# Altium schematic symbol library FPGA_Xilinx_Virtex6.SchLib: 28 symbols (part 1 of 21) (continued)
## XC6VHX250T-FF1154 (continued)
part N pins: AA1 GND (power), AA2 GND (power), AA5 GND (power), AA6 GND (power), AA9 GND (power), AA11 GND (power), AA13 GND (power), AA15 GND (power), AA17 GND (power), AA19 GND (power), AA21 GND (power), AA23 GND (power), AA26 GND (power), AA29 GND (power), AA30 GND (power), AA33 GND (power), AA34 GND (power), AB3 GND (power), AB4 GND (power), AB7 GND (power), AB9 GND (power), AB12 GND (power), AB14 GND (power), AB16 GND (power), AB18 GND (power), AB20 GND (power), AB22 GND (power), AB24 GND (power), AB26 GND (power), AB28 GND (power), AB31 GND (power), AB32 GND (power), AC1 GND (power), AC5 GND (power), AC6 GND (power), AC9 GND (power), AC15 GND (power), AC25 GND (power), AC26 GND (power), AC29 GND (power), AC30 GND (power), AC34 GND (power), AD4 GND (power), AD7 GND (power), AD9 GND (power), AD12 GND (power), AD22 GND (power), AD26 GND (power), AD28 GND (power), AD31 GND (power), AE1 GND (power), AE2 GND (power), AE5 GND (power), AE6 GND (power), AE9 GND (power), AE19 GND (power), AE26 GND (power), AE29 GND (power), AE30 GND (power), AE33 GND (power), AE34 GND (power), AF3 GND (power), AF4 GND (power), AF7 GND (power), AF9 GND (power), AF16 GND (power), AF26 GND (power), AF28 GND (power), AF31 GND (power), AF32 GND (power), AG1 GND (power), AG5 GND (power), AG6 GND (power), AG9 GND (power), AG13 GND (power), AG23 GND (power), AG26 GND (power), AG29 GND (power), AG30 GND (power), AG34 GND (power), AH4 GND (power), AH7 GND (power), AH9 GND (power), AH10 GND (power), AH20 GND (power), AH26 GND (power), AH28 GND (power), AH31 GND (power), AJ1 GND (power), AJ2 GND (power), AJ5 GND (power), AJ6 GND (power), AJ9 GND (power), AJ17 GND (power), AJ26 GND (power), AJ29 GND (power), AJ30 GND (power), AJ33 GND (power), AJ34 GND (power), AK3 GND (power), AK4 GND (power), AK7 GND (power), AK9 GND (power), AK14 GND (power), AK24 GND (power), AK26 GND (power), AK28 GND (power), AK31 GND (power), AK32 GND (power), AL1 GND (power), AL5 GND (power), AL6 GND (power), AL8 GND (power), AL9 GND (power), AL11 GND (power), AL21 GND (power), AL26 GND (power), AL27 GND (power), AL29 GND (power), AL30 GND (power), AL34 GND (power), AM4 GND (power), AM6 GND (power), AM7 GND (power), AM8 GND (power), AM18 GND (power), AM27 GND (power), AM28 GND (power), AM29 GND (power), AM31 GND (power), AN1 GND (power), AN2 GND (power), AN5 GND (power), AN6 GND (power), AN15 GND (power), AN25 GND (power), AN29 GND (power), AN30 GND (power), AN33 GND (power), AN34 GND (power), AP3 GND (power), AP4 GND (power), AP6 GND (power), AP12 GND (power), AP22 GND (power), AP29 GND (power), AP31 GND (power), AP32 GND (power), K28 GND (power), K31 GND (power), K32 GND (power), L1 GND (power), L5 GND (power), L6 GND (power), L9 GND (power), L11 GND (power), L21 GND (power), L26 GND (power), L29 GND (power), L30 GND (power), L34 GND (power), M4 GND (power), M7 GND (power), M9 GND (power), M18 GND (power), M26 GND (power), M28 GND (power), M31 GND (power), N1 GND (power), N2 GND (power), N5 GND (power), N6 GND (power), N9 GND (power), N11 GND (power), N13 GND (power), N15 GND (power), N17 GND (power), N19 GND (power), N21 GND (power), N23 GND (power), N25 GND (power), N26 GND (power), N29 GND (power), N30 GND (power), N33 GND (power), N34 GND (power), P3 GND (power), P4 GND (power), P7 GND (power), P9 GND (power), P12 GND (power), P14 GND (power), P16 GND (power), P18 GND (power), P20 GND (power), P22 GND (power), P24 GND (power), P26 GND (power), P28 GND (power), P31 GND (power), P32 GND (power), R1 GND (power), R5 GND (power), R6 GND (power), R9 GND (power), R11 GND (power), R13 GND (power), R15 GND (power), R17 GND (power), R19 GND (power), R21 GND (power), R23 GND (power), R25 GND (power), R26 GND (power), R29 GND (power), R30 GND (power), R34 GND (power), T4 GND (power), T7 GND (power), T9 GND (power), T10 GND (power), T12 GND (power), T14 GND (power), T16 GND (power), T20 GND (power), T22 GND (power), T24 GND (power), T25 GND (power), T26 GND (power), T28 GND (power), T31 GND (power), U1 GND (power), U2 GND (power), U5 GND (power), U6 GND (power), U9 GND (power), U10 GND (power), U11 GND (power), U13 GND (power), U15 GND (power), U19 GND (power), U21 GND (power), U23 GND (power), U25 GND (power), U26 GND (power), U29 GND (power), U30 GND (power), U33 GND (power), U34 GND (power), V3 GND (power), V4 GND (power), V7 GND (power), V9 GND (power), V10 GND (power), V12 GND (power), V14 GND (power), V16 GND (power), V20 GND (power), V22 GND (power), V24 GND (power), V25 GND (power), V26 GND (power), V28 GND (power), V31 GND (power), V32 GND (power), W1 GND (power), W5 GND (power), W6 GND (power), W9 GND (power), W10 GND (power), W11 GND (power), W13 GND (power), W15 GND (power), W19 GND (power), W21 GND (power), W23 GND (power), W25 GND (power), W26 GND (power), W29 GND (power), W30 GND (power), W34 GND (power), Y4 GND (power), Y7 GND (power), Y9 GND (power), Y10 GND (power), Y12 GND (power), Y14 GND (power), Y16 GND (power), Y18 GND (power), Y20 GND (power), Y22 GND (power), Y24 GND (power), Y25 GND (power), Y26 GND (power), Y28 GND (power), Y31 GND (power)

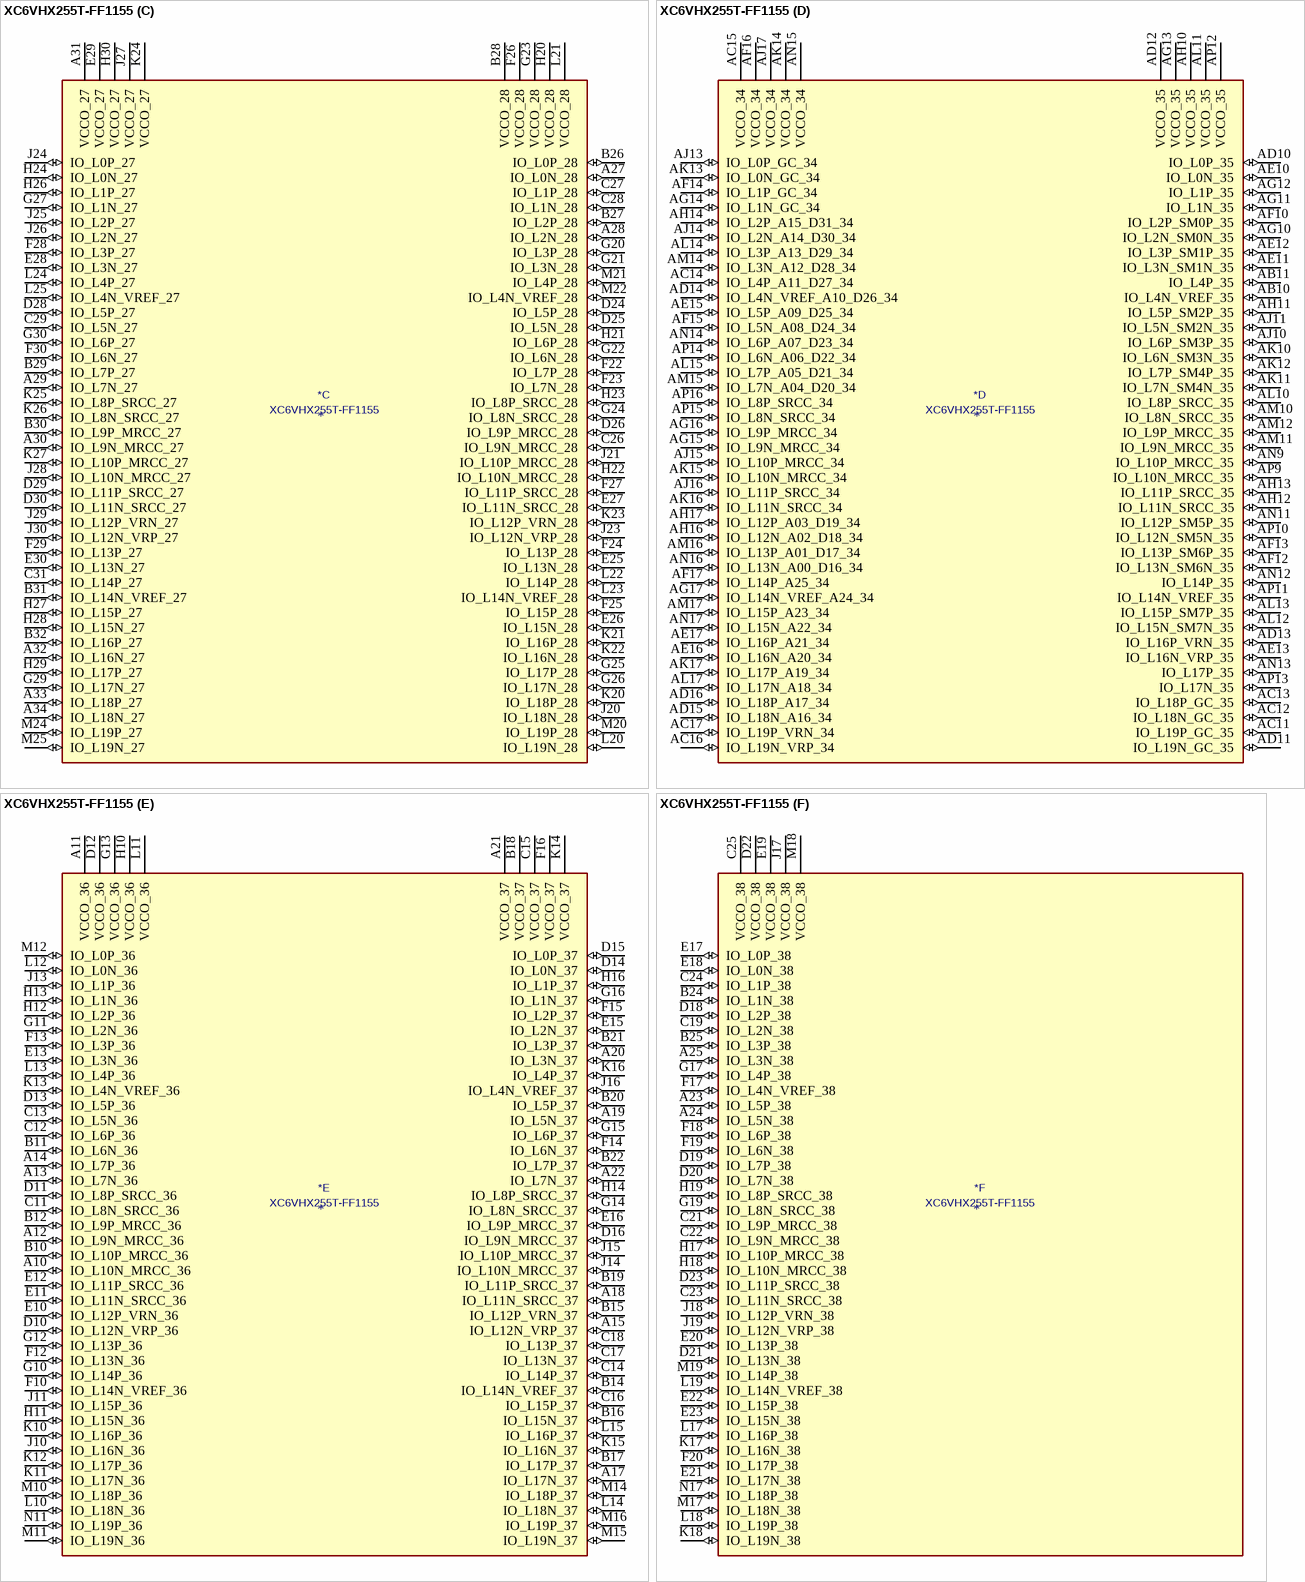
[diagram p3: symbol XC6VHX255T-FF1155]

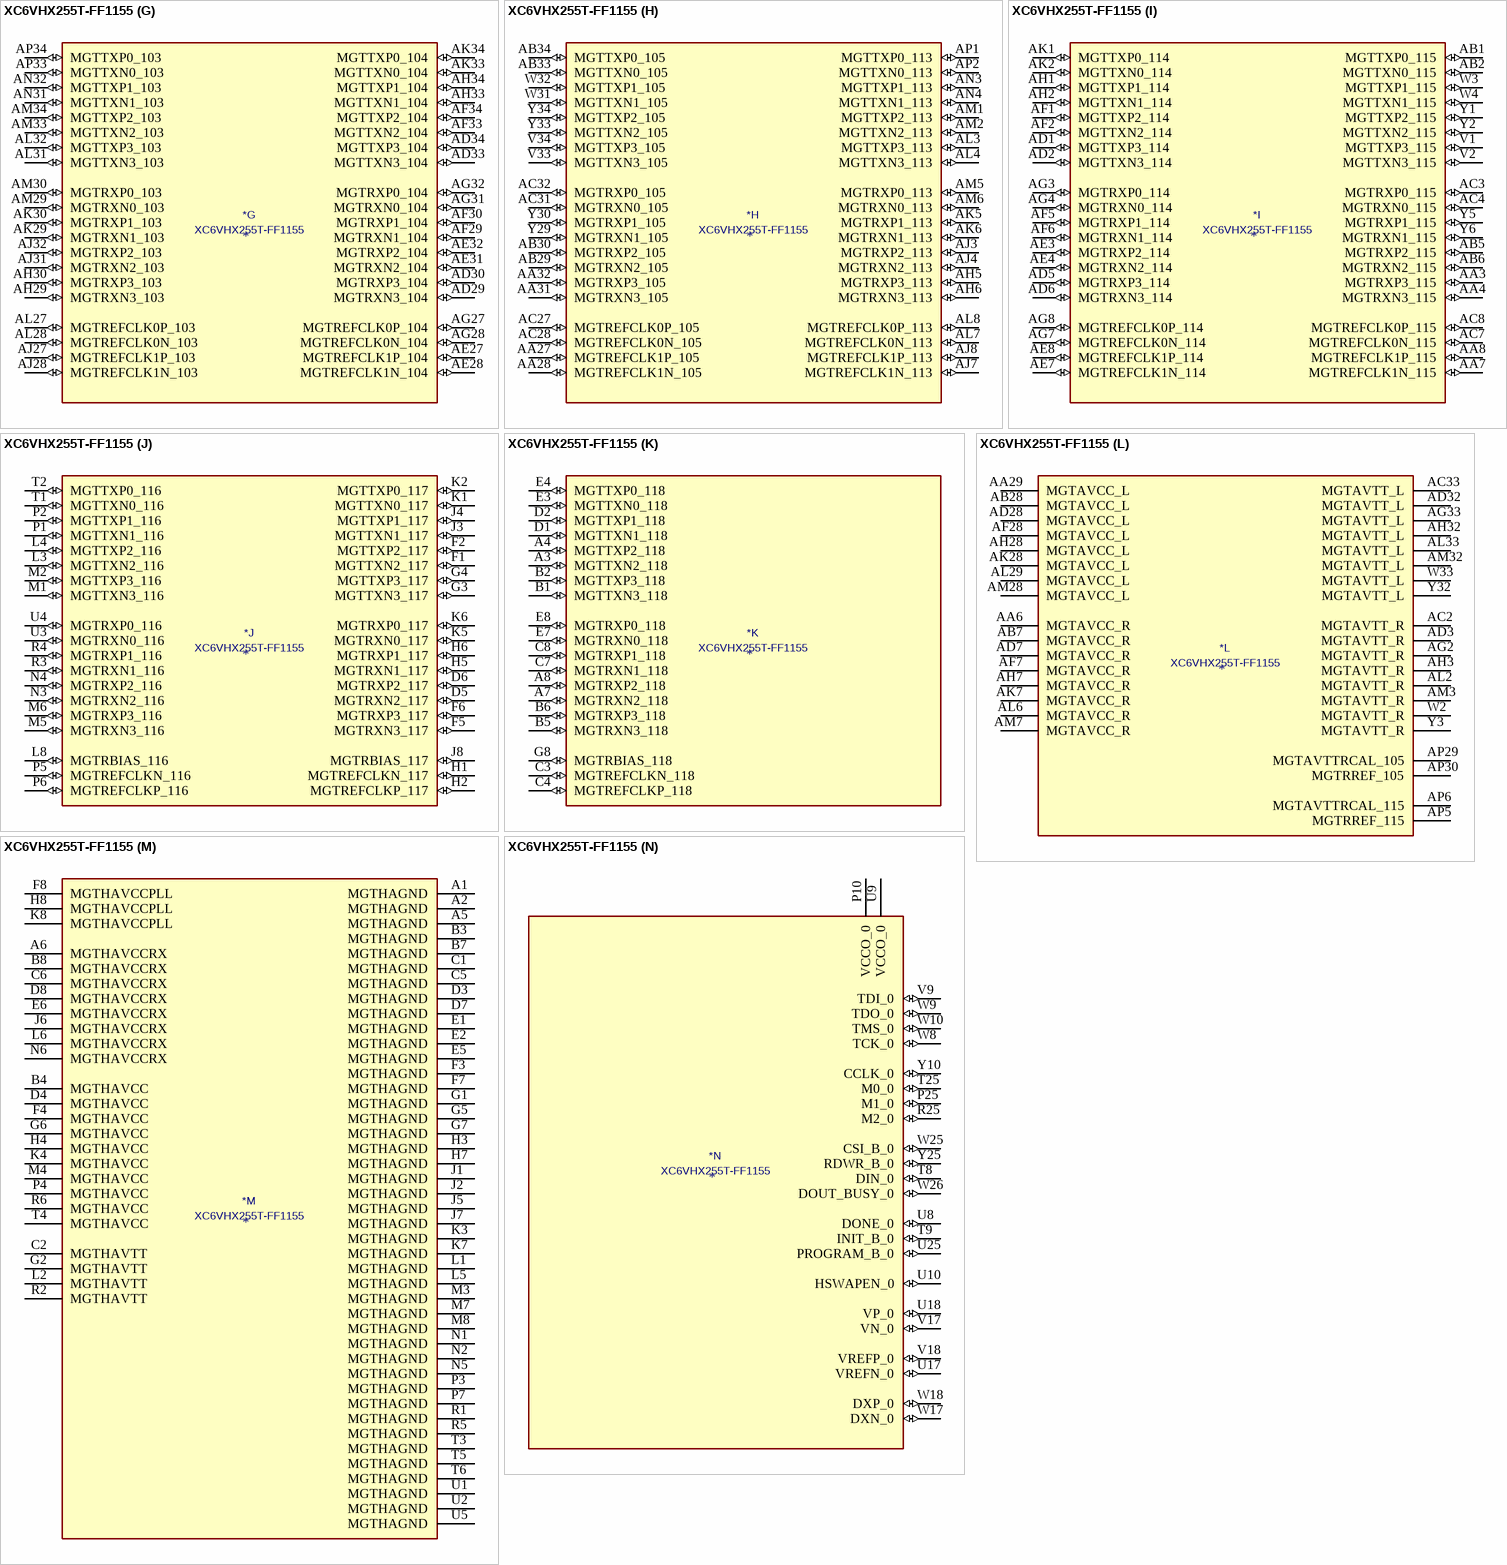
[diagram p4: symbol XC6VHX255T-FF1155]

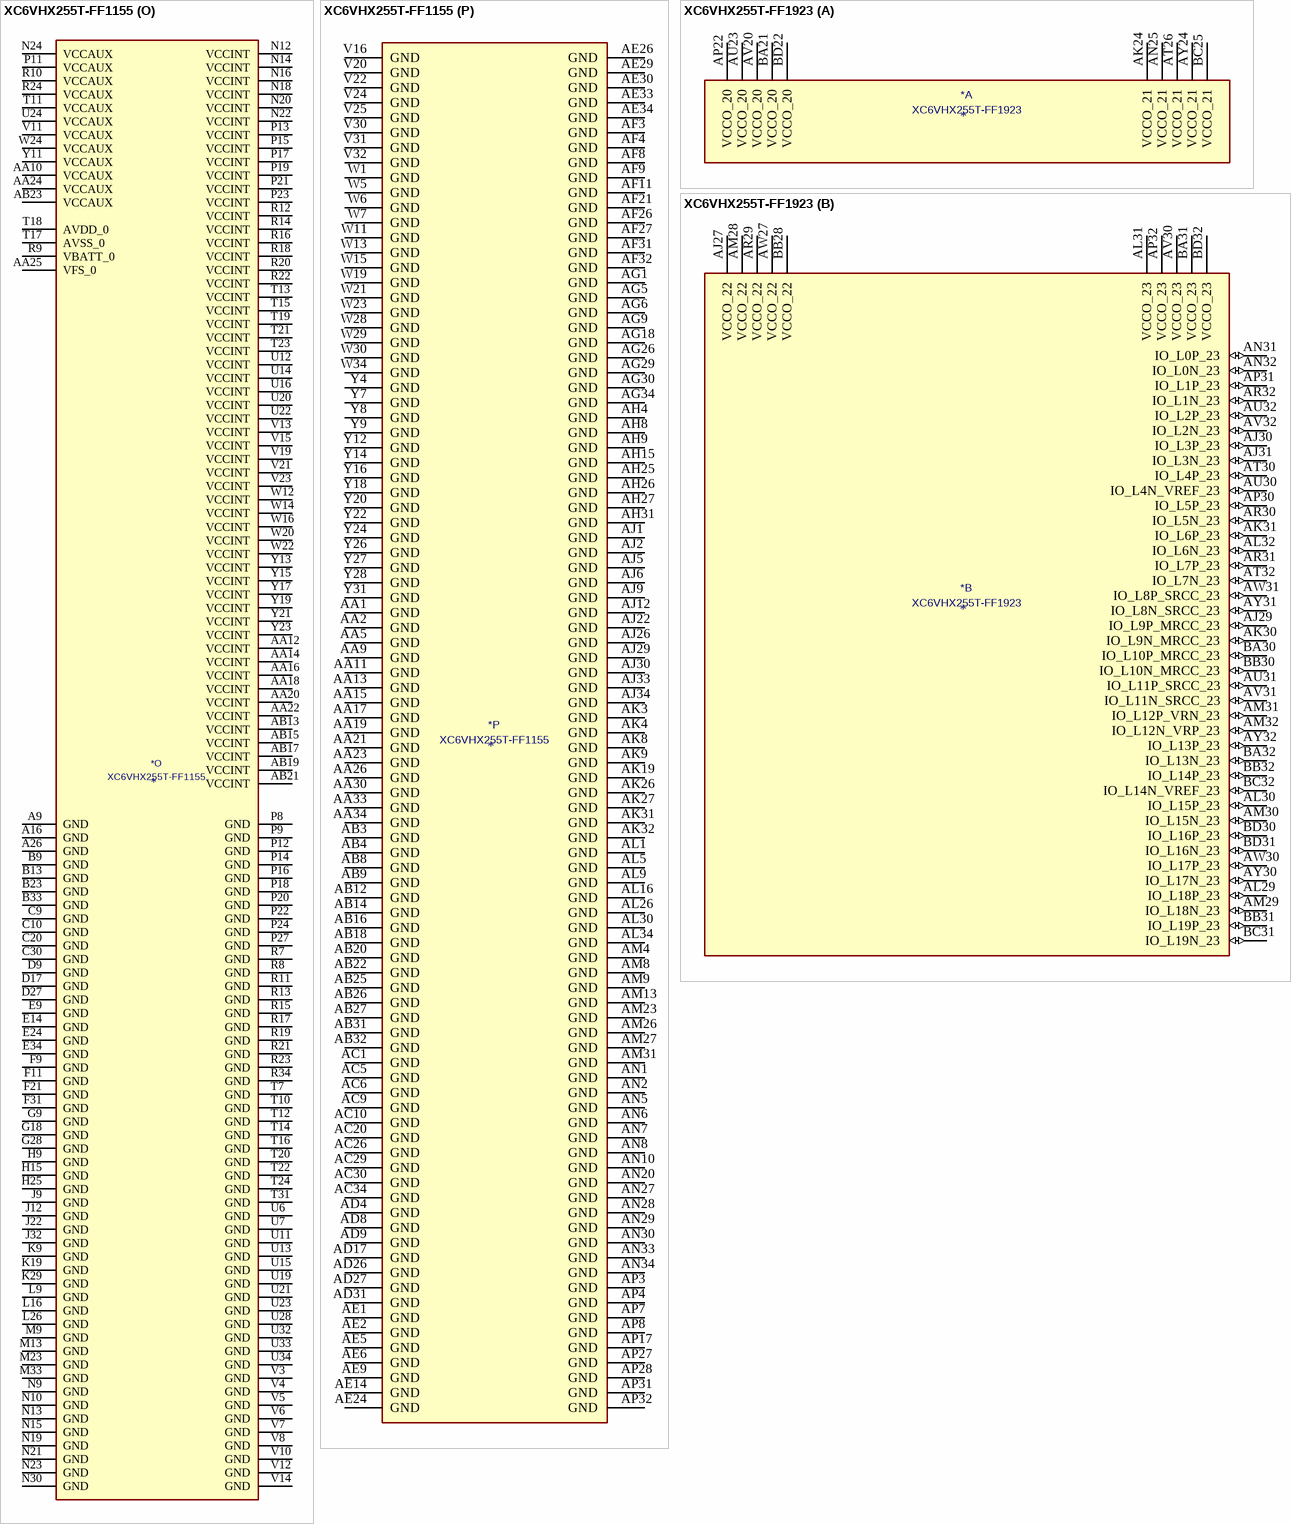
[diagram p5: symbols XC6VHX255T-FF1155 to XC6VHX255T-FF1923]

## XC6VHX255T-FF1155
designator *  value XC6VHX255T-FF1155
ki_keywords: FPGA; ki_description: Virtex 6 HXT 255 XC6VHX255T-FF1155
part A pins: AB24 IO_L4P_D11_24 (io), AC18 IO_L19P_23 (io), AC19 IO_L19N_23 (io), AC21 IO_L4P_23 (io), AC22 IO_L7P_D5_24 (io), AC23 IO_L7N_D4_24 (io), AC24 IO_L4N_VREF_D10_24 (io), AC25 VCCO_24 (power), AD18 IO_L17P_23 (io), AD19 IO_L12P_VRN_23 (io), AD20 IO_L12N_VRP_23 (io), AD21 IO_L4N_VREF_23 (io), AD22 VCCO_24 (power), AD23 IO_L5P_D9_24 (io), AD24 IO_L19P_24 (io), AD25 IO_L19N_24 (io), AE18 IO_L17N_23 (io), AE19 VCCO_23 (power), AE20 IO_L5P_23 (io), AE21 IO_L5N_23 (io), AE22 IO_L9P_MRCC_24 (io), AE23 IO_L5N_D8_24 (io), AE25 IO_L0P_GC_24 (io), AF18 IO_L13P_23 (io), AF19 IO_L13N_23 (io), AF20 IO_L10P_MRCC_23 (io), AF22 IO_L17P_VRN_24 (io), AF23 IO_L9N_MRCC_24 (io), AF24 IO_L2P_D15_24 (io), AF25 IO_L0N_GC_24 (io), AG19 IO_L9P_MRCC_23 (io), AG20 IO_L10N_MRCC_23 (io), AG21 IO_L1P_23 (io), AG22 IO_L17N_VRP_24 (io), AG23 VCCO_24 (power), AG24 IO_L12P_D3_24 (io), AG25 IO_L2N_D14_24 (io), AH18 IO_L15P_23 (io), AH19 IO_L9N_MRCC_23 (io), AH20 VCCO_23 (power), AH21 IO_L1N_23 (io), AH22 IO_L11P_SRCC_24 (io), AH23 IO_L11N_SRCC_24 (io), AH24 IO_L12N_D2_FS2_24 (io), AJ18 IO_L15N_23 (io), AJ19 IO_L14P_23 (io), AJ20 IO_L14N_VREF_23 (io), AJ21 IO_L0P_23 (io), AJ23 IO_L14P_FCS_B_24 (io), AJ24 IO_L14N_VREF_FOE_B_MOSI_24 (io), AJ25 IO_L6P_D7_24 (io), AK18 IO_L11P_SRCC_23 (io), AK20 IO_L8P_SRCC_23 (io), AK21 IO_L0N_23 (io), AK22 IO_L13P_D1_FS1_24 (io), AK23 IO_L13N_D0_FS0_24 (io), AK24 VCCO_24 (power), AK25 IO_L6N_D6_24 (io), AL18 IO_L11N_SRCC_23 (io), AL19 IO_L7P_23 (io), AL20 IO_L8N_SRCC_23 (io), AL21 VCCO_23 (power), AL22 IO_L15P_FWE_B_24 (io), AL23 IO_L3P_D13_24 (io), AL24 IO_L3N_D12_24 (io), AL25 IO_L1P_GC_24 (io), AM18 VCCO_23 (power), AM19 IO_L7N_23 (io), AM20 IO_L6P_23 (io), AM21 IO_L2P_23 (io), AM22 IO_L15N_RS1_24 (io), AM24 IO_L16P_RS0_24 (io), AM25 IO_L1N_GC_24 (io), AN18 IO_L18P_23 (io), AN19 IO_L3P_23 (io), AN21 IO_L6N_23 (io), AN22 IO_L2N_23 (io), AN23 IO_L18P_24 (io), AN24 IO_L16N_CSO_B_24 (io), AN25 VCCO_24 (power), AN26 IO_L8P_SRCC_24 (io), AP18 IO_L18N_23 (io), AP19 IO_L3N_23 (io), AP20 IO_L16P_23 (io), AP21 IO_L16N_23 (io), AP22 VCCO_23 (power), AP23 IO_L18N_24 (io), AP24 IO_L10P_MRCC_24 (io), AP25 IO_L10N_MRCC_24 (io), AP26 IO_L8N_SRCC_24 (io)
part B pins: B34 IO_L9N_MRCC_26 (io), C32 IO_L1N_26 (io), C33 IO_L9P_MRCC_26 (io), C34 IO_L0N_26 (io), D31 IO_L1P_26 (io), D32 VCCO_26 (power), D33 IO_L0P_26 (io), D34 IO_L8N_SRCC_26 (io), E31 IO_L3P_26 (io), E32 IO_L3N_26 (io), E33 IO_L8P_SRCC_26 (io), F32 IO_L5N_26 (io), F33 IO_L7N_26 (io), F34 IO_L10N_MRCC_26 (io), G31 IO_L5P_26 (io), G32 IO_L7P_26 (io), G33 VCCO_26 (power), G34 IO_L10P_MRCC_26 (io), H31 IO_L11N_SRCC_26 (io), H32 IO_L2P_26 (io), H33 IO_L2N_26 (io), H34 IO_L12N_VRP_26 (io), J31 IO_L11P_SRCC_26 (io), J33 IO_L6N_26 (io), J34 IO_L12P_VRN_26 (io), K28 IO_L4N_VREF_26 (io), K30 IO_L17N_26 (io), K31 IO_L13P_26 (io), K32 IO_L13N_26 (io), K33 IO_L6P_26 (io), K34 VCCO_26 (power), L27 IO_L4P_26 (io), L28 IO_L15P_26 (io), L29 IO_L15N_26 (io), L30 IO_L17P_26 (io), L31 VCCO_26 (power), L32 IO_L16N_26 (io), L33 IO_L14P_26 (io), L34 IO_L14N_VREF_26 (io), M26 IO_L19P_26 (io), M27 IO_L19N_26 (io), M28 VCCO_26 (power), M29 IO_L18P_26 (io), M30 IO_L18N_26 (io), M31 IO_L16P_26 (io), M32 IO_L0N_25 (io), M34 IO_L5N_SM10N_25 (io), N25 VCCO_25 (power), N26 IO_L17N_25 (io), N27 IO_L4P_25 (io), N28 IO_L4N_VREF_25 (io), N29 IO_L8N_SRCC_25 (io), N31 IO_L12N_SM13N_25 (io), N32 IO_L0P_25 (io), N33 IO_L1N_25 (io), N34 IO_L5P_SM10P_25 (io), P26 IO_L17P_25 (io), P28 IO_L2N_SM8N_25 (io), P29 IO_L8P_SRCC_25 (io), P30 IO_L3N_SM9N_25 (io), P31 IO_L12P_SM13P_25 (io), P32 VCCO_25 (power), P33 IO_L1P_25 (io), P34 IO_L9N_MRCC_25 (io), R26 IO_L6P_SM11P_25 (io), R27 IO_L6N_SM11N_25 (io), R28 IO_L2P_SM8P_25 (io), R29 VCCO_25 (power), R30 IO_L3P_SM9P_25 (io), R31 IO_L16P_VRN_25 (io), R32 IO_L16N_VRP_25 (io), R33 IO_L9P_MRCC_25 (io), T26 VCCO_25 (power), T27 IO_L11P_SRCC_25 (io), T28 IO_L11N_SRCC_25 (io), T29 IO_L7P_SM12P_25 (io), T30 IO_L7N_SM12N_25 (io), T32 IO_L10N_MRCC_25 (io), T33 IO_L13P_SM14P_25 (io), T34 IO_L13N_SM14N_25 (io), U26 IO_L14P_25 (io), U27 IO_L14N_VREF_25 (io), U29 IO_L15P_SM15P_25 (io), U30 IO_L15N_SM15N_25 (io), U31 IO_L10P_MRCC_25 (io), V26 IO_L18P_GC_25 (io), V27 IO_L18N_GC_25 (io), V28 IO_L19P_GC_25 (io), V29 IO_L19N_GC_25 (io), W27 VCCO_25 (power)
part C pins: A27 IO_L0N_28 (io), A28 IO_L2N_28 (io), A29 IO_L7N_27 (io), A30 IO_L9N_MRCC_27 (io), A31 VCCO_27 (power), A32 IO_L16N_27 (io), A33 IO_L18P_27 (io), A34 IO_L18N_27 (io), B26 IO_L0P_28 (io), B27 IO_L2P_28 (io), B28 VCCO_28 (power), B29 IO_L7P_27 (io), B30 IO_L9P_MRCC_27 (io), B31 IO_L14N_VREF_27 (io), B32 IO_L16P_27 (io), C26 IO_L9N_MRCC_28 (io), C27 IO_L1P_28 (io), C28 IO_L1N_28 (io), C29 IO_L5N_27 (io), C31 IO_L14P_27 (io), D24 IO_L5P_28 (io), D25 IO_L5N_28 (io), D26 IO_L9P_MRCC_28 (io), D28 IO_L5P_27 (io), D29 IO_L11P_SRCC_27 (io), D30 IO_L11N_SRCC_27 (io), E25 IO_L13N_28 (io), E26 IO_L15N_28 (io), E27 IO_L11N_SRCC_28 (io), E28 IO_L3N_27 (io), E29 VCCO_27 (power), E30 IO_L13N_27 (io), F22 IO_L7P_28 (io), F23 IO_L7N_28 (io), F24 IO_L13P_28 (io), F25 IO_L15P_28 (io), F26 VCCO_28 (power), F27 IO_L11P_SRCC_28 (io), F28 IO_L3P_27 (io), F29 IO_L13P_27 (io), F30 IO_L6N_27 (io), G20 IO_L3P_28 (io), G21 IO_L3N_28 (io), G22 IO_L6N_28 (io), G23 VCCO_28 (power), G24 IO_L8N_SRCC_28 (io), G25 IO_L17P_28 (io), G26 IO_L17N_28 (io), G27 IO_L1N_27 (io), G29 IO_L17N_27 (io), G30 IO_L6P_27 (io), H20 VCCO_28 (power), H21 IO_L6P_28 (io), H22 IO_L10N_MRCC_28 (io), H23 IO_L8P_SRCC_28 (io), H24 IO_L0N_27 (io), H26 IO_L1P_27 (io), H27 IO_L15P_27 (io), H28 IO_L15N_27 (io), H29 IO_L17P_27 (io), H30 VCCO_27 (power), J20 IO_L18N_28 (io), J21 IO_L10P_MRCC_28 (io), J23 IO_L12N_VRP_28 (io), J24 IO_L0P_27 (io), J25 IO_L2P_27 (io), J26 IO_L2N_27 (io), J27 VCCO_27 (power), J28 IO_L10N_MRCC_27 (io), J29 IO_L12P_VRN_27 (io), J30 IO_L12N_VRP_27 (io), K20 IO_L18P_28 (io), K21 IO_L16P_28 (io), K22 IO_L16N_28 (io), K23 IO_L12P_VRN_28 (io), K24 VCCO_27 (power), K25 IO_L8P_SRCC_27 (io), K26 IO_L8N_SRCC_27 (io), K27 IO_L10P_MRCC_27 (io), L20 IO_L19N_28 (io), L21 VCCO_28 (power), L22 IO_L14P_28 (io), L23 IO_L14N_VREF_28 (io), L24 IO_L4P_27 (io), L25 IO_L4N_VREF_27 (io), M20 IO_L19P_28 (io), M21 IO_L4P_28 (io), M22 IO_L4N_VREF_28 (io), M24 IO_L19P_27 (io), M25 IO_L19N_27 (io)
part D pins: AB10 IO_L4N_VREF_35 (io), AB11 IO_L4P_35 (io), AC11 IO_L19P_GC_35 (io), AC12 IO_L18N_GC_35 (io), AC13 IO_L18P_GC_35 (io), AC14 IO_L4P_A11_D27_34 (io), AC15 VCCO_34 (power), AC16 IO_L19N_VRP_34 (io), AC17 IO_L19P_VRN_34 (io), AD10 IO_L0P_35 (io), AD11 IO_L19N_GC_35 (io), AD12 VCCO_35 (power), AD13 IO_L16P_VRN_35 (io), AD14 IO_L4N_VREF_A10_D26_34 (io), AD15 IO_L18N_A16_34 (io), AD16 IO_L18P_A17_34 (io), AE10 IO_L0N_35 (io), AE11 IO_L3N_SM1N_35 (io), AE12 IO_L3P_SM1P_35 (io), AE13 IO_L16N_VRP_35 (io), AE15 IO_L5P_A09_D25_34 (io), AE16 IO_L16N_A20_34 (io), AE17 IO_L16P_A21_34 (io), AF10 IO_L2P_SM0P_35 (io), AF12 IO_L13N_SM6N_35 (io), AF13 IO_L13P_SM6P_35 (io), AF14 IO_L1P_GC_34 (io), AF15 IO_L5N_A08_D24_34 (io), AF16 VCCO_34 (power), AF17 IO_L14P_A25_34 (io), AG10 IO_L2N_SM0N_35 (io), AG11 IO_L1N_35 (io), AG12 IO_L1P_35 (io), AG13 VCCO_35 (power), AG14 IO_L1N_GC_34 (io), AG15 IO_L9N_MRCC_34 (io), AG16 IO_L9P_MRCC_34 (io), AG17 IO_L14N_VREF_A24_34 (io), AH10 VCCO_35 (power), AH11 IO_L5P_SM2P_35 (io), AH12 IO_L11N_SRCC_35 (io), AH13 IO_L11P_SRCC_35 (io), AH14 IO_L2P_A15_D31_34 (io), AH16 IO_L12N_A02_D18_34 (io), AH17 IO_L12P_A03_D19_34 (io), AJ10 IO_L6P_SM3P_35 (io), AJ11 IO_L5N_SM2N_35 (io), AJ13 IO_L0P_GC_34 (io), AJ14 IO_L2N_A14_D30_34 (io), AJ15 IO_L10P_MRCC_34 (io), AJ16 IO_L11P_SRCC_34 (io), AJ17 VCCO_34 (power), AK10 IO_L6N_SM3N_35 (io), AK11 IO_L7N_SM4N_35 (io), AK12 IO_L7P_SM4P_35 (io), AK13 IO_L0N_GC_34 (io), AK14 VCCO_34 (power), AK15 IO_L10N_MRCC_34 (io), AK16 IO_L11N_SRCC_34 (io), AK17 IO_L17P_A19_34 (io), AL10 IO_L8P_SRCC_35 (io), AL11 VCCO_35 (power), AL12 IO_L15N_SM7N_35 (io), AL13 IO_L15P_SM7P_35 (io), AL14 IO_L3P_A13_D29_34 (io), AL15 IO_L7P_A05_D21_34 (io), AL17 IO_L17N_A18_34 (io), AM10 IO_L8N_SRCC_35 (io), AM11 IO_L9N_MRCC_35 (io), AM12 IO_L9P_MRCC_35 (io), AM14 IO_L3N_A12_D28_34 (io), AM15 IO_L7N_A04_D20_34 (io), AM16 IO_L13P_A01_D17_34 (io), AM17 IO_L15P_A23_34 (io), AN9 IO_L10P_MRCC_35 (io), AN11 IO_L12P_SM5P_35 (io), AN12 IO_L14P_35 (io), AN13 IO_L17P_35 (io), AN14 IO_L6P_A07_D23_34 (io), AN15 VCCO_34 (power), AN16 IO_L13N_A00_D16_34 (io), AN17 IO_L15N_A22_34 (io), AP9 IO_L10N_MRCC_35 (io), AP10 IO_L12N_SM5N_35 (io), AP11 IO_L14N_VREF_35 (io), AP12 VCCO_35 (power), AP13 IO_L17N_35 (io), AP14 IO_L6N_A06_D22_34 (io), AP15 IO_L8N_SRCC_34 (io), AP16 IO_L8P_SRCC_34 (io)
part E pins: A10 IO_L10N_MRCC_36 (io), A11 VCCO_36 (power), A12 IO_L9N_MRCC_36 (io), A13 IO_L7N_36 (io), A14 IO_L7P_36 (io), A15 IO_L12N_VRP_37 (io), A17 IO_L17N_37 (io), A18 IO_L11N_SRCC_37 (io), A19 IO_L5N_37 (io), A20 IO_L3N_37 (io), A21 VCCO_37 (power), A22 IO_L7N_37 (io), B10 IO_L10P_MRCC_36 (io), B11 IO_L6N_36 (io), B12 IO_L9P_MRCC_36 (io), B14 IO_L14N_VREF_37 (io), B15 IO_L12P_VRN_37 (io), B16 IO_L15N_37 (io), B17 IO_L17P_37 (io), B18 VCCO_37 (power), B19 IO_L11P_SRCC_37 (io), B20 IO_L5P_37 (io), B21 IO_L3P_37 (io), B22 IO_L7P_37 (io), C11 IO_L8N_SRCC_36 (io), C12 IO_L6P_36 (io), C13 IO_L5N_36 (io), C14 IO_L14P_37 (io), C15 VCCO_37 (power), C16 IO_L15P_37 (io), C17 IO_L13N_37 (io), C18 IO_L13P_37 (io), D10 IO_L12N_VRP_36 (io), D11 IO_L8P_SRCC_36 (io), D12 VCCO_36 (power), D13 IO_L5P_36 (io), D14 IO_L0N_37 (io), D15 IO_L0P_37 (io), D16 IO_L9N_MRCC_37 (io), E10 IO_L12P_VRN_36 (io), E11 IO_L11N_SRCC_36 (io), E12 IO_L11P_SRCC_36 (io), E13 IO_L3N_36 (io), E15 IO_L2N_37 (io), E16 IO_L9P_MRCC_37 (io), F10 IO_L14N_VREF_36 (io), F12 IO_L13N_36 (io), F13 IO_L3P_36 (io), F14 IO_L6N_37 (io), F15 IO_L2P_37 (io), F16 VCCO_37 (power), G10 IO_L14P_36 (io), G11 IO_L2N_36 (io), G12 IO_L13P_36 (io), G13 VCCO_36 (power), G14 IO_L8N_SRCC_37 (io), G15 IO_L6P_37 (io), G16 IO_L1N_37 (io), H10 VCCO_36 (power), H11 IO_L15N_36 (io), H12 IO_L2P_36 (io), H13 IO_L1N_36 (io), H14 IO_L8P_SRCC_37 (io), H16 IO_L1P_37 (io), J10 IO_L16N_36 (io), J11 IO_L15P_36 (io), J13 IO_L1P_36 (io), J14 IO_L10N_MRCC_37 (io), J15 IO_L10P_MRCC_37 (io), J16 IO_L4N_VREF_37 (io), K10 IO_L16P_36 (io), K11 IO_L17N_36 (io), K12 IO_L17P_36 (io), K13 IO_L4N_VREF_36 (io), K14 VCCO_37 (power), K15 IO_L16N_37 (io), K16 IO_L4P_37 (io), L10 IO_L18N_36 (io), L11 VCCO_36 (power), L12 IO_L0N_36 (io), L13 IO_L4P_36 (io), L14 IO_L18N_37 (io), L15 IO_L16P_37 (io), M10 IO_L18P_36 (io), M11 IO_L19N_36 (io), M12 IO_L0P_36 (io), M14 IO_L18P_37 (io), M15 IO_L19N_37 (io), M16 IO_L19P_37 (io), N11 IO_L19P_36 (io)
part F pins: A23 IO_L5P_38 (io), A24 IO_L5N_38 (io), A25 IO_L3N_38 (io), B24 IO_L1N_38 (io), B25 IO_L3P_38 (io), C19 IO_L2N_38 (io), C21 IO_L9P_MRCC_38 (io), C22 IO_L9N_MRCC_38 (io), C23 IO_L11N_SRCC_38 (io), C24 IO_L1P_38 (io), C25 VCCO_38 (power), D18 IO_L2P_38 (io), D19 IO_L7P_38 (io), D20 IO_L7N_38 (io), D21 IO_L13N_38 (io), D22 VCCO_38 (power), D23 IO_L11P_SRCC_38 (io), E17 IO_L0P_38 (io), E18 IO_L0N_38 (io), E19 VCCO_38 (power), E20 IO_L13P_38 (io), E21 IO_L17N_38 (io), E22 IO_L15P_38 (io), E23 IO_L15N_38 (io), F17 IO_L4N_VREF_38 (io), F18 IO_L6P_38 (io), F19 IO_L6N_38 (io), F20 IO_L17P_38 (io), G17 IO_L4P_38 (io), G19 IO_L8N_SRCC_38 (io), H17 IO_L10P_MRCC_38 (io), H18 IO_L10N_MRCC_38 (io), H19 IO_L8P_SRCC_38 (io), J17 VCCO_38 (power), J18 IO_L12P_VRN_38 (io), J19 IO_L12N_VRP_38 (io), K17 IO_L16N_38 (io), K18 IO_L19N_38 (io), L17 IO_L16P_38 (io), L18 IO_L19P_38 (io), L19 IO_L14N_VREF_38 (io), M17 IO_L18N_38 (io), M18 VCCO_38 (power), M19 IO_L14P_38 (io), N17 IO_L18P_38 (io)